# Altium footprint library 陪测板.PcbLib: 72 footprints (part 3 of 5)
Each footprint in its own frame and in the unit in brackets; x right, y up, seen from the top. Pads: shape width x height; smd on the part's side, far side on the other; paste and mask are expansions set on the pad; w line width, h text height; cw(c..) or ccw(c..) is an arc to the next point about the centre after c.
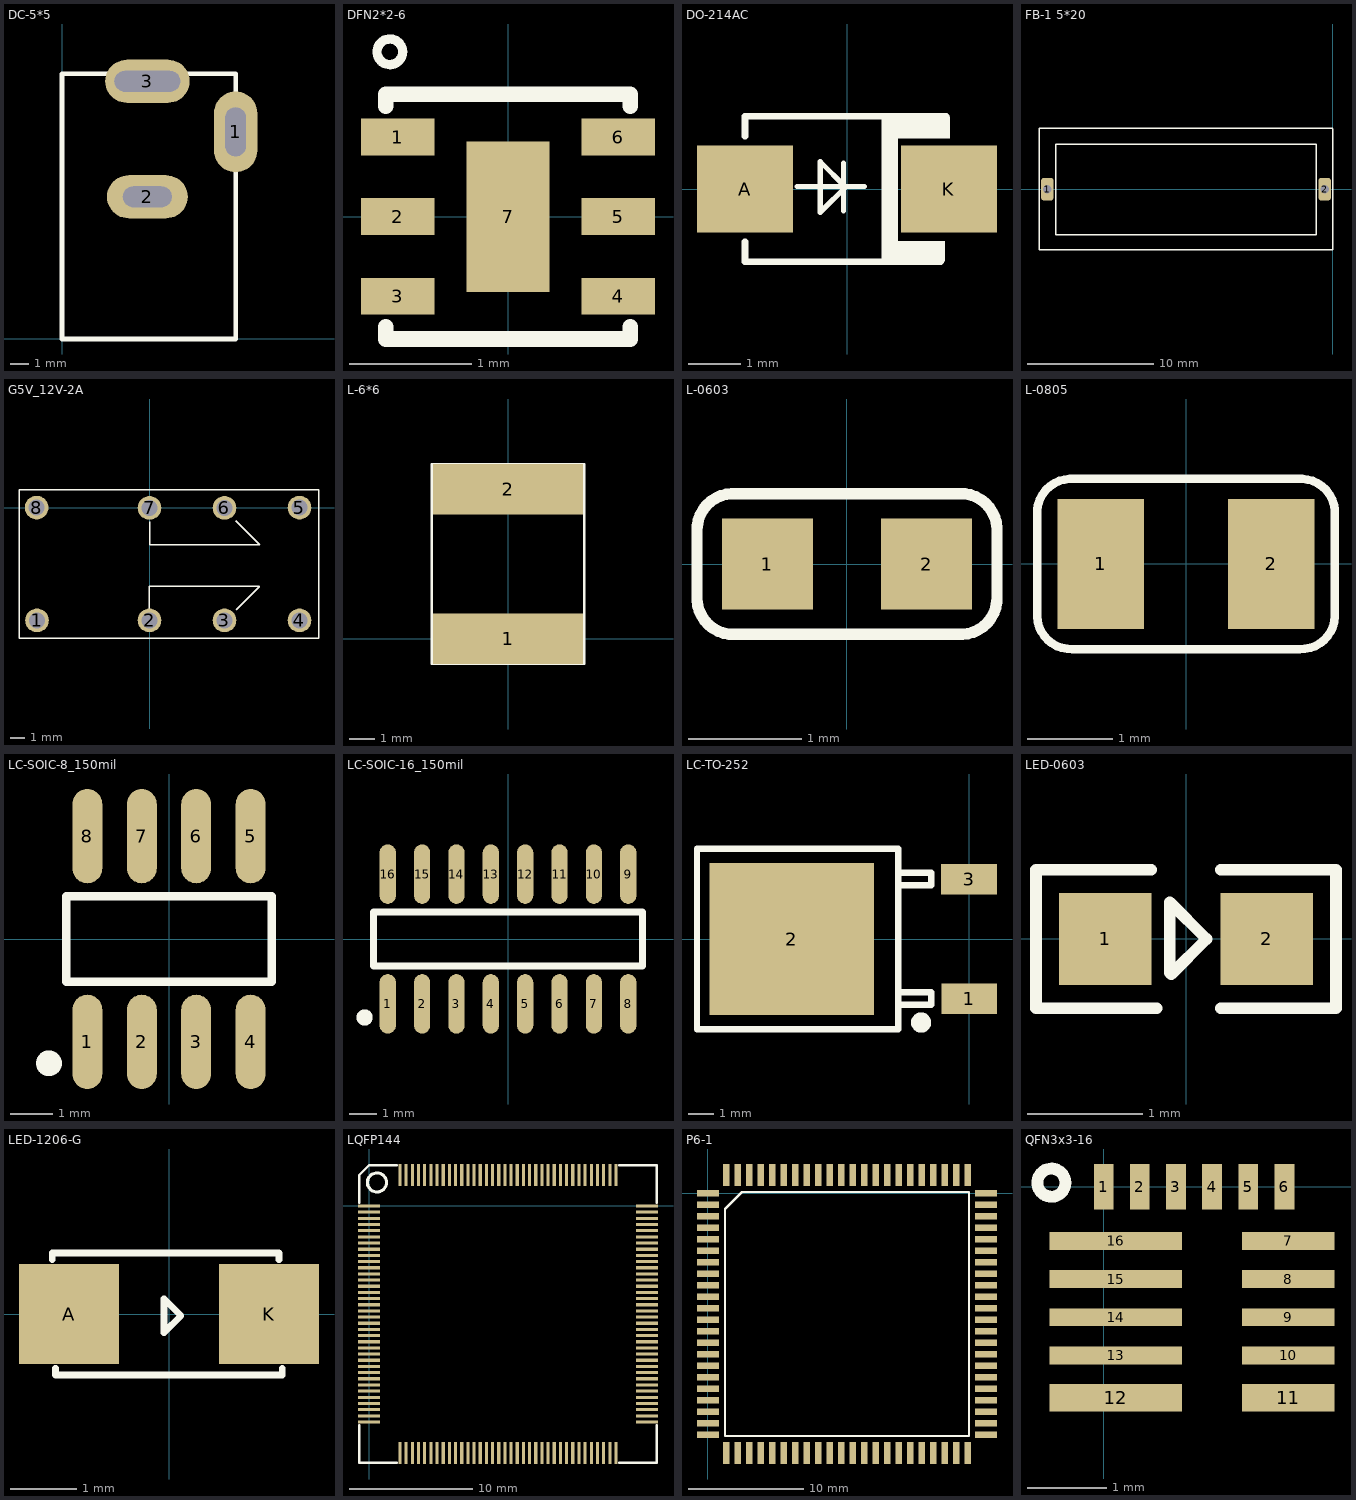
[diagram p2: the footprints below, top view; thin cyan lines are the x and y axes]

## DC-5*5 [mm]
pads (3):
  oval 2.3x4.3 hole 1.1 slot 2.6 at 90 deg: 1(9.22,10.998)
  oval 4.3x2.3 hole 1.1 slot 2.6 at 0 deg: 2(4.521,7.544)
  oval 4.5x2.3 hole 1.1 slot 3.5 at 0 deg: 3(4.521,13.691)
Top Overlay:
  lines w0.254: -0.025,-0.025 -0.025,12.878 -0.025,14.097 9.22,14.097 9.22,-0.025 -0.025,-0.025

## DFN2*2-6 [mm]
pads (7):
  rect 0.6x0.3 smd: 1(-0.9,0.65) 2(-0.9,0) 3(-0.9,-0.65) 4(0.9,-0.65) 5(0.9,0) 6(0.9,0.65)
  rect 0.68x1.23 smd: 7(0,0)
Top Overlay:
  circle w0.076: c-0.965,1.346 r0.105
  lines w0.127: -1,-0.9 -1,-1 1,-1 1,-0.9 ; -1,0.9 -1,1 1,1 1,0.9

## DO-214AC [mm]
pads (2):
  rect 1.85x1.67 smd: A(-1.965,0) K(1.965,0)
Top Overlay:
  rectangle: 0.86,-1.4 1.885,-1
  rectangle: 0.86,0.975 1.985,1.4
  rectangle: 0.66,-1.4 0.985,1.4
  lines w0.1: -0.965,0.05 0.335,0.05 ; -0.515,-0.45 -0.515,0.525 -0.04,0.05 ; -0.49,-0.425 -0.015,0.05 ; -0.065,-0.425 -0.065,0.5
  lines w0.127: -1.965,-1.016 -1.965,-1.4 1.81,-1.4 ; -1.965,1.016 -1.965,1.4 1.91,1.4
3D body "DO-214AC.STEP": height 2.4, standoff 0, extent -2.265,-1.35 2.335,1.35

## FB-1 5*20 [mm]
pads (2):
  rrect50% 1x1.8 hole 0.65 square: 1(-22.657,0) 2(-0.66,0)
Top Overlay:
  lines w0.1: -0.025,4.826 -23.317,4.826 -23.317,-4.801 0,-4.801 0,4.801 ; -21.996,-3.607 -1.321,-3.607 -1.321,3.556 -21.996,3.556 -21.996,-3.607

## G5V_12V-2A [mm]
pads (8):
  round 1.6 hole 1.1: 1(-7.62,-7.62) 2(0,-7.62) 3(5.08,-7.62) 4(10.16,-7.62) 5(10.16,0.025) 6(5.08,0) 7(0,0) 8(-7.645,0.025)
Top Overlay:
  lines w0.1: -0.025,-6.858 -0.025,-5.309 7.442,-5.309 7.442,-5.334 5.893,-6.883 5.867,-6.883 ; 0,-0.94 0,-2.489 7.468,-2.489 5.829,-0.851 ; -8.839,-8.839 -8.839,1.245 11.481,1.245 11.481,-8.839 -8.839,-8.839

## L-6*6 [mm]
pads (2):
  rect 6x2 smd: 1(0,0) 2(0,5.969)
Top Overlay:
  lines w0.1: -3.048,-0.991 3.048,-0.991 3.048,6.96 -3.048,6.96 -3.048,-0.991

## L-0603 [mm]
pads (2):
  rect 0.8x0.8 smd: 1(-0.7,0) 2(0.7,0)
Top Overlay:
  lines w0.1: -1.32,-0.313 ccw(c-1,-0.3) -0.987,-0.62 1.013,-0.62 ccw(c1,-0.3) 1.32,-0.287 1.32,0.313 ccw(c1,0.3) 0.987,0.62 -1.013,0.62 ccw(c-1,0.3) -1.32,0.287 -1.32,-0.313
3D body "电感-0603.STEP": height 0.8, standoff 0, extent -0.8,-0.52 0.8,0.5

## L-0805 [mil]
pads (2):
  rect 40x60 smd: 1(-39.37,0) 2(39.37,0)
Top Overlay:
  lines w3.94: -68.89,-24.25 ccw(c-53.15,-23.62) -52.52,-39.36 52.52,-39.37 ccw(c53.15,-23.62) 68.89,-24.25 68.89,22.99 ccw(c53.15,23.62) 53.78,39.36 -53.78,39.37 ccw(c-53.15,23.62) -68.89,22.99 -68.89,-24.25
3D body "电感-0805.STEP": height 39.37, standoff 0, extent -43.31,-31.3 43.31,32.48

## LC-SOIC-8_150mil [mm]
pads (8):
  oval 0.7x2.2 smd: 1(-1.905,-2.4) 2(-0.635,-2.4) 3(0.635,-2.4) 4(1.905,-2.4) 5(1.905,2.4) 6(0.635,2.4) 7(-0.635,2.4) 8(-1.905,2.4)
Top Overlay:
  circle w0.3: c-2.8,-2.9 r0.15
  lines w0.2: -2.4,-1 2.4,-1 2.4,1 -2.4,1 -2.4,-1

## LC-SOIC-16_150mil [mm]
pads (16):
  oval 0.6x2.2 smd: 1(-4.445,-2.4) 2(-3.175,-2.4) 3(-1.905,-2.4) 4(-0.635,-2.4) 5(0.635,-2.4) 6(1.905,-2.4) 7(3.175,-2.4) 8(4.445,-2.4) 9(4.445,2.4) 10(3.175,2.4) 11(1.905,2.4) 12(0.635,2.4) 13(-0.635,2.4) 14(-1.905,2.4) 15(-3.175,2.4) 16(-4.445,2.4)
Top Overlay:
  circle w0.3: c-5.3,-2.9 r0.15
  lines w0.254: -4.975,-1 -4.975,1 4.975,1 4.975,-1 -4.975,-1

## LC-TO-252 [mm]
pads (3):
  rect 2.2x1.2 smd: 1(0,-2.361) 3(-0.004,2.361)
  rect 6.5x6 smd: 2(-7,0)
Top Overlay:
  circle w0.4: c-1.9,-3.3 r0.2
  lines w0.254: -2.804,2.123 -1.504,2.123 -1.504,2.623 -2.804,2.623 ; -2.8,-2.6 -1.5,-2.6 -1.5,-2.1 -2.8,-2.1 ; -10.75,-3.573 -10.75,3.573 -2.8,3.573 -2.8,-3.573 -10.75,-3.573
3D body "TO-252.STEP": height 2.44, standoff 0.03, extent -9.738,-3.27 0.2,3.27

## LED-0603 [mm]
pads (2):
  rect 0.8x0.8 smd: 1(-0.7,0) 2(0.7,0)
Top Overlay:
  lines w0.1: -0.3,0.6 -1.3,0.6 -1.3,-0.6 -0.254,-0.6 ; 0.3,-0.6 1.3,-0.6 1.3,0.6 0.3,0.6 ; -0.14,-0.292 -0.127,-0.305 0.178,0 -0.14,0.318 -0.14,-0.292
3D body "C-0603(1.6x0.8x0.8).STEP": height 0.8, standoff 0, extent -0.8,-0.4 0.8,0.4

## LED-1206-G [mm] "3.2mmX1.6mmX0.8mm"
height 0.8
pads (2):
  rect 1.5x1.5 smd: A(-1.5,0) K(1.5,0)
Top Overlay:
  lines w0.1: -1.751,0.814 -1.751,0.914 1.649,0.914 1.649,0.814 ; -1.702,-0.814 -1.702,-0.914 1.7,-0.914 1.7,-0.814 ; -0.076,-0.279 0.178,-0.025 -0.076,0.229 -0.076,-0.279
3D body "LED-1206.STEP": height 0.8, standoff 0, extent -1.6,-0.813 1.6,0.787

## LQFP144 [mm]
pads (144):
  rect 1.8x0.254 smd: 1(-0.009,0.001) 2(-0.009,-0.499) 3(-0.009,-0.999) 4(-0.009,-1.499) 5(-0.009,-1.999) 6(-0.009,-2.499) 7(-0.009,-2.999) 8(-0.009,-3.499) 9(-0.009,-3.999) 10(-0.009,-4.499) 11(-0.009,-4.999) 12(-0.009,-5.499) 13(-0.009,-5.999) 14(-0.009,-6.499) 15(-0.009,-6.999) 16(-0.009,-7.499) 17(-0.009,-7.999) 18(-0.009,-8.499) 19(-0.009,-8.999) 20(-0.009,-9.499) 21(-0.009,-9.999) 22(-0.009,-10.499) 23(-0.009,-10.999) 24(-0.009,-11.499) 25(-0.009,-11.999) 26(-0.009,-12.499) 27(-0.009,-12.999) 28(-0.009,-13.499) 29(-0.009,-13.999) 30(-0.009,-14.499) 31(-0.009,-14.999) 32(-0.009,-15.499) 33(-0.009,-15.999) 34(-0.009,-16.499) 35(-0.009,-16.999) 36(-0.009,-17.499) 73(22.491,-17.499) 74(22.491,-16.999) 75(22.491,-16.499) 76(22.491,-15.999) 77(22.491,-15.499) 78(22.491,-14.999) 79(22.491,-14.499) 80(22.491,-13.999) 81(22.491,-13.499) 82(22.491,-12.999) 83(22.491,-12.499) 84(22.491,-11.999) 85(22.491,-11.499) 86(22.491,-10.999) 87(22.491,-10.499) 88(22.491,-9.999) 89(22.491,-9.499) 90(22.491,-8.999) 91(22.491,-8.499) 92(22.491,-7.999) 93(22.491,-7.499) 94(22.491,-6.999) 95(22.491,-6.499) 96(22.491,-5.999) 97(22.491,-5.499) 98(22.491,-4.999) 99(22.491,-4.499) 100(22.491,-3.999) 101(22.491,-3.499) 102(22.491,-2.999) 103(22.491,-2.499) 104(22.491,-1.999) 105(22.491,-1.499) 106(22.491,-0.999) 107(22.491,-0.499) 108(22.491,0.001)
  rect 0.254x1.8 smd: 37(2.491,-19.999) 38(2.991,-19.999) 39(3.491,-19.999) 40(3.991,-19.999) 41(4.491,-19.999) 42(4.991,-19.999) 43(5.491,-19.999) 44(5.991,-19.999) 45(6.491,-19.999) 46(6.991,-19.999) 47(7.491,-19.999) 48(7.991,-19.999) 49(8.491,-19.999) 50(8.991,-19.999) 51(9.491,-19.999) 52(9.991,-19.999) 53(10.491,-19.999) 54(10.991,-19.999) 55(11.491,-19.999) 56(11.991,-19.999) 57(12.491,-19.999) 58(12.991,-19.999) 59(13.491,-19.999) 60(13.991,-19.999) 61(14.491,-19.999) 62(14.991,-19.999) 63(15.491,-19.999) 64(15.991,-19.999) 65(16.491,-19.999) 66(16.991,-19.999) 67(17.491,-19.999) 68(17.991,-19.999) 69(18.491,-19.999) 70(18.991,-19.999) 71(19.491,-19.999) 72(19.991,-19.999) 109(19.991,2.501) 110(19.491,2.501) 111(18.991,2.501) 112(18.491,2.501) 113(17.991,2.501) 114(17.491,2.501) 115(16.991,2.501) 116(16.491,2.501) 117(15.991,2.501) 118(15.491,2.501) 119(14.991,2.501) 120(14.491,2.501) 121(13.991,2.501) 122(13.491,2.501) 123(12.991,2.501) 124(12.491,2.501) 125(11.991,2.501) 126(11.491,2.501) 127(10.991,2.501) 128(10.491,2.501) 129(9.991,2.501) 130(9.491,2.501) 131(8.991,2.501) 132(8.491,2.501) 133(7.991,2.501) 134(7.491,2.501) 135(6.991,2.501) 136(6.491,2.501) 137(5.991,2.501) 138(5.491,2.501) 139(4.991,2.501) 140(4.491,2.501) 141(3.991,2.501) 142(3.491,2.501) 143(2.991,2.501) 144(2.491,2.501)
Top Overlay:
  circle w0.254: c0.624,1.905 r0.773
  lines w0.2: -0.809,-17.749 -0.809,-20.799 2.241,-20.799 ; -0.809,0.251 -0.809,2.501 -0.009,3.301 2.241,3.301 ; 20.241,-20.799 23.291,-20.799 23.291,-17.749 ; 20.241,3.301 23.291,3.301 23.291,0.251

## P6-1 [mm]
pads (88):
  rect 1.9x0.55 smd: 1(0,0) 2(0,-1) 3(0,-2) 4(0,-3) 5(0,-4) 6(0,-5) 7(0,-6) 8(0,-7) 9(0,-8) 10(0,-9) 11(0,-10) 12(0,-11) 13(0,-12) 14(0,-13) 15(0,-14) 16(0,-15) 17(0,-16) 18(0,-17) 19(0,-18) 20(0,-19) 21(0,-20) 22(0,-21) 45(24.2,-21) 46(24.2,-20) 47(24.2,-19) 48(24.2,-18) 49(24.2,-17) 50(24.2,-16) 51(24.2,-15) 52(24.2,-14) 53(24.2,-13) 54(24.2,-12) 55(24.2,-11) 56(24.2,-10) 57(24.2,-9) 58(24.2,-8) 59(24.2,-7) 60(24.2,-6) 61(24.2,-5) 62(24.2,-4) 63(24.2,-3) 64(24.2,-2) 65(24.2,-1) 66(24.2,0)
  rect 0.55x1.9 smd: 23(1.6,-22.6) 24(2.6,-22.6) 25(3.6,-22.6) 26(4.6,-22.6) 27(5.6,-22.6) 28(6.6,-22.6) 29(7.6,-22.6) 30(8.6,-22.6) 31(9.6,-22.6) 32(10.6,-22.6) 33(11.6,-22.6) 34(12.6,-22.6) 35(13.6,-22.6) 36(14.6,-22.6) 37(15.6,-22.6) 38(16.6,-22.6) 39(17.6,-22.6) 40(18.6,-22.6) 41(19.6,-22.6) 42(20.6,-22.6) 43(21.6,-22.6) 44(22.6,-22.6) 67(22.6,1.6) 68(21.6,1.6) 69(20.6,1.6) 70(19.6,1.6) 71(18.6,1.6) 72(17.6,1.6) 73(16.6,1.6) 74(15.6,1.6) 75(14.6,1.6) 76(13.6,1.6) 77(12.6,1.6) 78(11.6,1.6) 79(10.6,1.6) 80(9.6,1.6) 81(8.6,1.6) 82(7.6,1.6) 83(6.6,1.6) 84(5.6,1.6) 85(4.6,1.6) 86(3.6,1.6) 87(2.6,1.6) 88(1.6,1.6)
Top Overlay:
  lines w0.2: 1.485,-21.115 1.485,-1.37 2.97,0.115 22.715,0.115 22.715,-21.115 1.485,-21.115

## QFN3x3-16 [mm]
pads (16):
  rect 0.25x0.575 smd: 1(0,0) 2(0.457,0) 3(0.914,0) 4(1.372,0) 5(1.829,0) 6(2.286,0)
  rect 1.17x0.225 smd: 7(2.337,-0.686) 8(2.337,-1.168) 9(2.337,-1.651) 10(2.337,-2.134)
  rect 1.17x0.35 smd: 11(2.337,-2.667)
  rect 1.68x0.35 smd: 12(0.152,-2.667)
  rect 1.68x0.225 smd: 13(0.152,-2.134) 14(0.152,-1.651) 15(0.152,-1.168) 16(0.152,-0.686)
Top Overlay:
  circle w0.15: c-0.66,0.051 r0.178